# Altium schematic symbol library Regulator_Switching.SchLib: 1070 symbols (part 1 of 9) (continued)
## BD9G341EFJ (continued)

## BD9001F
designator *  value BD9001F
ki_keywords: DC-DC Step-Down Switching Regulator; ki_description: 48V 2A, Flexible Step-Down Switching Regulator, SO-8; ki_fp_filters: SOIC*3.9x4.9mm*P1.27mm*; Footprint: Package_SO:SOIC-8_3.9x4.9mm_P1.27mm; Supplier: http://rohmfs.rohm.com/en/products/databook/datasheet/ic/power/switching_regulator/bd9778f-e.pdf
footprint SOIC-8_3.9x4.9mm_P1.27mm
pins: 1 SW (out), 2 NC (in) hidden, 3 FB, 4 INV (in), 6 RT, 7 GND (power), 8 VIN (power)

## BD9778F
designator *  value BD9778F
ki_keywords: DC-DC Step-Down Switching Regulator; ki_description: 35V 2A, Flexible Step-Down Switching Regulator, SO-8; ki_fp_filters: SOIC*3.9x4.9mm*P1.27mm*; Footprint: Package_SO:SOIC-8_3.9x4.9mm_P1.27mm; Supplier: http://rohmfs.rohm.com/en/products/databook/datasheet/ic/power/switching_regulator/bd9778f-e.pdf
footprint SOIC-8_3.9x4.9mm_P1.27mm
pins: 1 VIN (power), 2 SW (out), 3 FB, 4 INV (in), 5 EN, 6 RT, 7 GND (power), 8 PVIN (power)

## BD9778HFP
designator *  value BD9778HFP
ki_keywords: DC-DC Step-Down Switching Regulator; ki_description: 35V 2A, Flexible Step-Down Switching Regulator, HRP7; ki_fp_filters: Rohm*HRP7*; Footprint: Package_TO_SOT_SMD:Rohm_HRP7; Supplier: http://rohmfs.rohm.com/en/products/databook/datasheet/ic/power/switching_regulator/bd9778f-e.pdf
footprint Rohm_HRP7
pins: 1 VIN (power), 2 SW (out), 3 FB, 4 GND (power), 5 INV (in), 6 RT, 7 EN

## BD9781HFP
designator *  value BD9781HFP
ki_keywords: DC-DC Step-Down Switching Regulator; ki_description: 35V 4A, Flexible Step-Down Switching Regulator, HRP7; ki_fp_filters: Rohm*HRP7*; Footprint: Package_TO_SOT_SMD:Rohm_HRP7; Supplier: http://rohmfs.rohm.com/en/products/databook/datasheet/ic/power/switching_regulator/bd9778f-e.pdf
footprint Rohm_HRP7
pins: 1 VIN (power), 2 SW (out), 3 RT, 4 GND (power), 5 FB, 6 INV (in), 7 EN/SYNC

## CRE1S0305S3C
designator *  value CRE1S0305S3C
ki_keywords: Murata isolated isolation dc-dc converter transformer; ki_description: 3.3V to 5V 200mA, Isolated 2W Single-Output DC-DC Converter Modules with 3kV isolation, SIP-4; ki_fp_filters: Converter*DCDC*Murata*CRE1xxxxxx3C*; Footprint: Converter_DCDC:Converter_DCDC_Murata_CRE1xxxxxx3C_THT; Supplier: http://power.murata.com/datasheet?/data/power/ncl/kdc_cre1.pdf
footprint Converter_DCDC_Murata_CRE1xxxxxx3C_THT
pins: 1 -VIN (power), 2 +VIN (power), 3 -VOUT (power), 4 +VOUT (power)

## CRE1S0505DC
designator *  value CRE1S0505DC
ki_keywords: Murata isolated isolation dc-dc converter transformer; ki_description: 5V to 5V 200mA DC-DC Converter with 1kV isolation, DC-package; ki_fp_filters: Converter*DCDC*Murata*CRE1xxxxxxDC*; Footprint: Converter_DCDC:Converter_DCDC_Murata_CRE1xxxxxxDC_THT; Supplier: http://power.murata.com/datasheet?/data/power/ncl/kdc_cre1.pdf
footprint Converter_DCDC_Murata_CRE1xxxxxxDC_THT
pins: 1 -VIN (power), 4 +VIN (power), 5 +VOUT (power), 7 -VOUT (power)

## CRE1S0505S3C
designator *  value CRE1S0505S3C
ki_keywords: Murata isolated isolation dc-dc converter transformer; ki_description: 5V to 5V 200mA, Isolated 2W Single-Output DC-DC Converter Modules with 3kV isolation, SIP-4; ki_fp_filters: Converter*DCDC*Murata*CRE1xxxxxx3C*; Footprint: Converter_DCDC:Converter_DCDC_Murata_CRE1xxxxxx3C_THT; Supplier: http://power.murata.com/datasheet?/data/power/ncl/kdc_cre1.pdf
footprint Converter_DCDC_Murata_CRE1xxxxxx3C_THT
pins: 1 -VIN (power), 2 +VIN (power), 3 -VOUT (power), 4 +VOUT (power)

## CRE1S0505SC
designator *  value CRE1S0505SC
ki_keywords: Murata isolated isolation dc-dc converter transformer; ki_description: 5V to 5V 200mA DC-DC Converter with 1kV isolation, SIP-4; ki_fp_filters: Converter*DCDC*Murata*CRE1xxxxxxSC*; Footprint: Converter_DCDC:Converter_DCDC_Murata_CRE1xxxxxxSC_THT; Supplier: http://power.murata.com/datasheet?/data/power/ncl/kdc_cre1.pdf
footprint Converter_DCDC_Murata_CRE1xxxxxxSC_THT
pins: 1 -VIN (power), 2 +VIN (power), 3 -VOUT (power), 4 +VOUT (power)

## CRE1S0515SC
designator *  value CRE1S0515SC
ki_keywords: Murata isolated isolation dc-dc converter transformer; ki_description: 15V to 5V 67mA DC-DC Converter with 1kV isolation, SIP-4; ki_fp_filters: Converter*DCDC*Murata*CRE1xxxxxxSC*; Footprint: Converter_DCDC:Converter_DCDC_Murata_CRE1xxxxxxSC_THT; Supplier: http://power.murata.com/datasheet?/data/power/ncl/kdc_cre1.pdf
footprint Converter_DCDC_Murata_CRE1xxxxxxSC_THT
pins: 1 -VIN (power), 2 +VIN (power), 3 -VOUT (power), 4 +VOUT (power)

## CRE1S1205SC
designator *  value CRE1S1205SC
ki_keywords: Murata isolated isolation dc-dc converter transformer; ki_description: 12V to 5V 200mA DC-DC Converter with 1kV isolation, SIP-4; ki_fp_filters: Converter*DCDC*Murata*CRE1xxxxxxSC*; Footprint: Converter_DCDC:Converter_DCDC_Murata_CRE1xxxxxxSC_THT; Supplier: http://power.murata.com/datasheet?/data/power/ncl/kdc_cre1.pdf
footprint Converter_DCDC_Murata_CRE1xxxxxxSC_THT
pins: 1 -VIN (power), 2 +VIN (power), 3 -VOUT (power), 4 +VOUT (power)

## CRE1S1212SC
designator *  value CRE1S1212SC
ki_keywords: Murata isolated isolation dc-dc converter transformer; ki_description: 12V to 12V 83mA DC-DC Converter with 1kV isolation, SIP-4; ki_fp_filters: Converter*DCDC*Murata*CRE1xxxxxxSC*; Footprint: Converter_DCDC:Converter_DCDC_Murata_CRE1xxxxxxSC_THT; Supplier: http://power.murata.com/datasheet?/data/power/ncl/kdc_cre1.pdf
footprint Converter_DCDC_Murata_CRE1xxxxxxSC_THT
pins: 1 -VIN (power), 2 +VIN (power), 3 -VOUT (power), 4 +VOUT (power)

## CRE1S2405SC
designator *  value CRE1S2405SC
ki_keywords: Murata isolated isolation dc-dc converter transformer; ki_description: 24V to 5V 200mA DC-DC Converter with 1kV isolation, SIP-4; ki_fp_filters: Converter*DCDC*Murata*CRE1xxxxxxSC*; Footprint: Converter_DCDC:Converter_DCDC_Murata_CRE1xxxxxxSC_THT; Supplier: http://power.murata.com/datasheet?/data/power/ncl/kdc_cre1.pdf
footprint Converter_DCDC_Murata_CRE1xxxxxxSC_THT
pins: 1 -VIN (power), 2 +VIN (power), 3 -VOUT (power), 4 +VOUT (power)

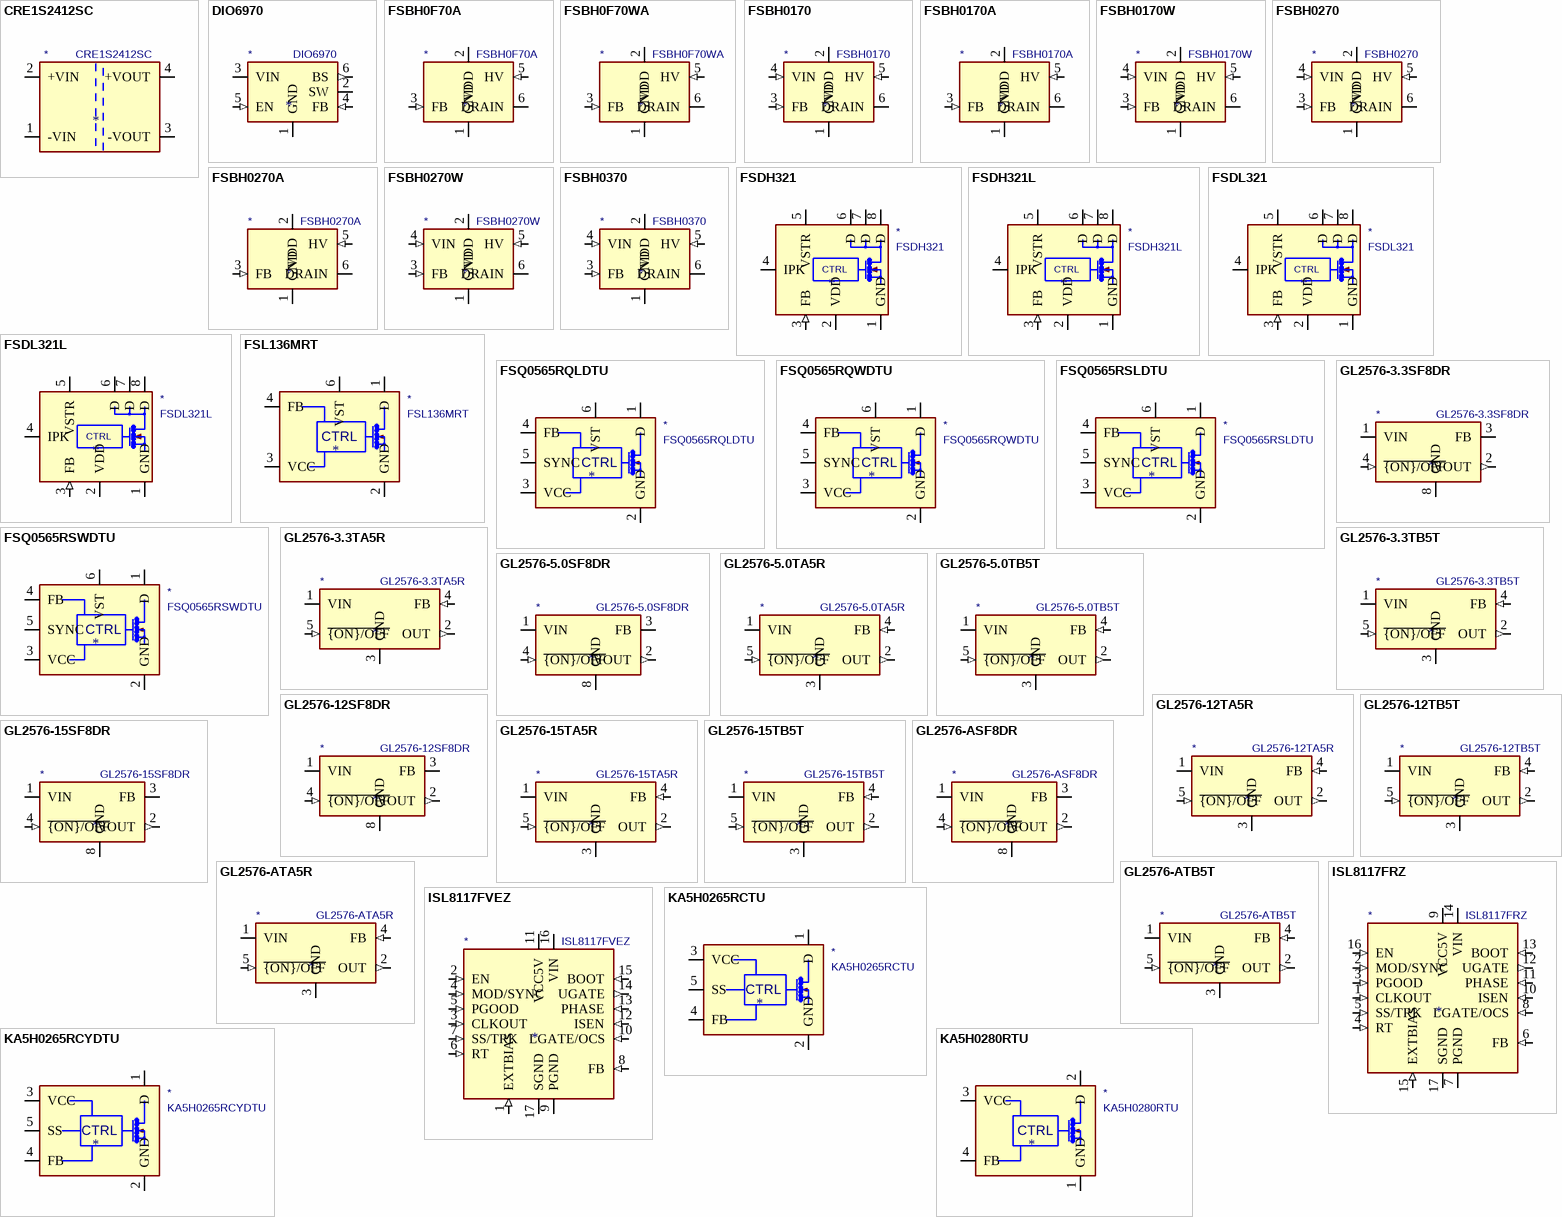
[diagram p2: symbols CRE1S2412SC to KA5H0280RTU]

## CRE1S2412SC
designator *  value CRE1S2412SC
ki_keywords: Murata isolated isolation dc-dc converter transformer; ki_description: 24V to 12V 83mA DC-DC Converter with 1kV isolation, SIP-4; ki_fp_filters: Converter*DCDC*Murata*CRE1xxxxxxSC*; Footprint: Converter_DCDC:Converter_DCDC_Murata_CRE1xxxxxxSC_THT; Supplier: http://power.murata.com/datasheet?/data/power/ncl/kdc_cre1.pdf
footprint Converter_DCDC_Murata_CRE1xxxxxxSC_THT
pins: 1 -VIN (power), 2 +VIN (power), 3 -VOUT (power), 4 +VOUT (power)

## DIO6970
designator *  value DIO6970
ki_keywords: smps buck boost inverting; ki_description: High-Efficiency 2A, 24V Input Synchronous Step Down Converter, SOT-23-6; ki_fp_filters: SOT?23*; Footprint: Package_TO_SOT_SMD:SOT-23-6; Supplier: http://www.dioo.com/uploads/product/20190313/7a4d03690a9be004035eb1035a429f24.pdf
footprint SOT-23-6
pins: 1 GND (power), 2 SW (power), 3 VIN (power), 4 FB (in), 5 EN (in), 6 BS (out)

## FSBH0F70A
designator *  value FSBH0F70A
ki_keywords: smps regulator; ki_description: Green Mode Fairchild Power Switch, 700V Vds, 0.5A Id, 10W/8W 230V/85-265V, DIP-8; ki_fp_filters: DIP*W7.62mm*; Footprint: Package_DIP:DIP-8_W7.62mm; Supplier: https://www.onsemi.com/pub/Collateral/FSBH0270-D.PDF
footprint DIP-8_W7.62mm
pins: 1 GND (power), 2 VDD (power), 3 FB (in), 4 NC (in) hidden, 5 HV (in), 6 DRAIN (oc), 7 DRAIN (oc) hidden, 8 DRAIN (oc) hidden

## FSBH0F70WA
designator *  value FSBH0F70WA
ki_keywords: smps regulator; ki_description: Green Mode Fairchild Power Switch, 700V Vds, 0.5A Id, 10W/8W 230V/85-265V, DIP-8; ki_fp_filters: DIP*W7.62mm*; Footprint: Package_DIP:DIP-8_W7.62mm; Supplier: http://www.onsemi.com/pub/Collateral/FSBH0270W-D.pdf
footprint DIP-8_W7.62mm
pins: 1 GND (power), 2 VDD (power), 3 FB (in), 4 NC (in) hidden, 5 HV (in), 6 DRAIN (oc), 7 DRAIN (oc) hidden, 8 DRAIN (oc) hidden

## FSBH0170
designator *  value FSBH0170
ki_keywords: smps regulator; ki_description: Green Mode Fairchild Power Switch, 700V Vds, 1.0A Id, 15W/13W 230V/85-265V, VIN Pin, DIP-8; ki_fp_filters: DIP*W7.62mm*; Footprint: Package_DIP:DIP-8_W7.62mm; Supplier: https://www.onsemi.com/pub/Collateral/FSBH0270-D.PDF
footprint DIP-8_W7.62mm
pins: 1 GND (power), 2 VDD (power), 3 FB (in), 4 VIN (in), 5 HV (in), 6 DRAIN (oc), 7 DRAIN (oc) hidden, 8 DRAIN (oc) hidden

## FSBH0170A
designator *  value FSBH0170A
ki_keywords: smps regulator; ki_description: Green Mode Fairchild Power Switch, 700V Vds, 1.0A Id, 15W/13W 230V/85-265V, DIP-8; ki_fp_filters: DIP*W7.62mm*; Footprint: Package_DIP:DIP-8_W7.62mm; Supplier: https://www.onsemi.com/pub/Collateral/FSBH0270-D.PDF
footprint DIP-8_W7.62mm
pins: 1 GND (power), 2 VDD (power), 3 FB (in), 4 NC (in) hidden, 5 HV (in), 6 DRAIN (oc), 7 DRAIN (oc) hidden, 8 DRAIN (oc) hidden

## FSBH0170W
designator *  value FSBH0170W
ki_keywords: smps regulator; ki_description: Green Mode Fairchild Power Switch, 700V Vds, 1.0A Id, 15W/13W 230V/85-265V, VIN Pin, DIP-8; ki_fp_filters: DIP*W7.62mm*; Footprint: Package_DIP:DIP-8_W7.62mm; Supplier: http://www.onsemi.com/pub/Collateral/FSBH0270W-D.pdf
footprint DIP-8_W7.62mm
pins: 1 GND (power), 2 VDD (power), 3 FB (in), 4 VIN (in), 5 HV (in), 6 DRAIN (oc), 7 DRAIN (oc) hidden, 8 DRAIN (oc) hidden

## FSBH0270
designator *  value FSBH0270
ki_keywords: smps regulator; ki_description: Green Mode Fairchild Power Switch, 700V Vds, 2.0A Id, 20W/16W 230V/85-265V, VIN Pin, DIP-8; ki_fp_filters: DIP*W7.62mm*; Footprint: Package_DIP:DIP-8_W7.62mm; Supplier: https://www.onsemi.com/pub/Collateral/FSBH0270-D.PDF
footprint DIP-8_W7.62mm
pins: 1 GND (power), 2 VDD (power), 3 FB (in), 4 VIN (in), 5 HV (in), 6 DRAIN (oc), 7 DRAIN (oc) hidden, 8 DRAIN (oc) hidden

## FSBH0270A
designator *  value FSBH0270A
ki_keywords: smps regulator; ki_description: Green Mode Fairchild Power Switch, 700V Vds, 2.0A Id, 20W/16W 230V/85-265V, DIP-8; ki_fp_filters: DIP*W7.62mm*; Footprint: Package_DIP:DIP-8_W7.62mm; Supplier: https://www.onsemi.com/pub/Collateral/FSBH0270-D.PDF
footprint DIP-8_W7.62mm
pins: 1 GND (power), 2 VDD (power), 3 FB (in), 4 NC (in) hidden, 5 HV (in), 6 DRAIN (oc), 7 DRAIN (oc) hidden, 8 DRAIN (oc) hidden

## FSBH0270W
designator *  value FSBH0270W
ki_keywords: smps regulator; ki_description: Green Mode Fairchild Power Switch, 700V Vds, 2.0A Id, 20W/16W 230V/85-265V, VIN Pin, DIP-8; ki_fp_filters: DIP*W7.62mm*; Footprint: Package_DIP:DIP-8_W7.62mm; Supplier: http://www.onsemi.com/pub/Collateral/FSBH0270W-D.pdf
footprint DIP-8_W7.62mm
pins: 1 GND (power), 2 VDD (power), 3 FB (in), 4 VIN (in), 5 HV (in), 6 DRAIN (oc), 7 DRAIN (oc) hidden, 8 DRAIN (oc) hidden

## FSBH0370
designator *  value FSBH0370
ki_keywords: smps regulator; ki_description: Green Mode Fairchild Power Switch, 700V Vds, 3.0A Id, 25W/19W 230V/85-265V, VIN Pin, DIP-8; ki_fp_filters: DIP*W7.62mm*; Footprint: Package_DIP:DIP-8_W7.62mm; Supplier: https://www.onsemi.com/pub/Collateral/FSBH0270-D.PDF
footprint DIP-8_W7.62mm
pins: 1 GND (power), 2 VDD (power), 3 FB (in), 4 VIN (in), 5 HV (in), 6 DRAIN (oc), 7 DRAIN (oc) hidden, 8 DRAIN (oc) hidden

## FSDH321
designator *  value FSDH321
ki_keywords: SMPS Controller with MOSFET 17W AC-DC; ki_description: 17W SMPS Controller, 100kHz, AC-DC, PDIP-8; ki_fp_filters: DIP*W7.62mm*; Footprint: Package_DIP:DIP-8_W7.62mm; Supplier: https://www.onsemi.com/pub/Collateral/FSDH321JP-D.pdf
footprint DIP-8_W7.62mm
pins: 1 GND (power), 2 VDD (power), 3 FB (in), 4 IPK, 5 VSTR, 6 D, 7 D, 8 D
text: CTRL

## FSDH321L
designator *  value FSDH321L
ki_keywords: SMPS Controller with MOSFET 17W AC-DC; ki_description: 17W SMPS Controller, 100kHz, AC-DC, SMD-8; ki_fp_filters: Fairchild*LSOP*; Footprint: Package_DIP:Fairchild_LSOP-8; Supplier: https://www.onsemi.com/pub/Collateral/FSDH321JP-D.pdf
footprint Fairchild_LSOP-8
pins: 1 GND (power), 2 VDD (power), 3 FB (in), 4 IPK, 5 VSTR, 6 D, 7 D, 8 D
text: CTRL

## FSDL321
designator *  value FSDL321
ki_keywords: SMPS Controller with MOSFET 17W AC-DC; ki_description: 17W SMPS Controller, 50kHz, AC-DC, PDIP-8; ki_fp_filters: DIP*W7.62mm*; Footprint: Package_DIP:DIP-8_W7.62mm; Supplier: https://www.onsemi.com/pub/Collateral/FSDH321JP-D.pdf
footprint DIP-8_W7.62mm
pins: 1 GND (power), 2 VDD (power), 3 FB (in), 4 IPK, 5 VSTR, 6 D, 7 D, 8 D
text: CTRL

## FSDL321L
designator *  value FSDL321L
ki_keywords: SMPS Controller with MOSFET 17W AC-DC; ki_description: 17W SMPS Controller, 50kHz, AC-DC, SMD-8; ki_fp_filters: Fairchild*LSOP*; Footprint: Package_DIP:Fairchild_LSOP-8; Supplier: https://www.onsemi.com/pub/Collateral/FSDH321JP-D.pdf
footprint Fairchild_LSOP-8
pins: 1 GND (power), 2 VDD (power), 3 FB (in), 4 IPK, 5 VSTR, 6 D, 7 D, 8 D
text: CTRL

## FSL136MRT
designator *  value FSL136MRT
ki_keywords: SMPS Controller 50W AC-DC; ki_description: 67kHz SMPS Controller w/ Soft Start, max. 50W AC-DC, TO-220F-6L; ki_fp_filters: Fairchild*TO*220F*6L*; Footprint: Package_TO_SOT_THT:Fairchild_TO-220F-6L; Supplier: https://www.onsemi.com/pub/Collateral/FSL136MRT-D.pdf
footprint Fairchild_TO-220F-6L
pins: 1 D, 2 GND (power), 3 VCC (power), 4 FB, 6 VST
text: CTRL

## FSQ0565RQLDTU
designator *  value FSQ0565RQLDTU
ki_keywords: Quasi Resonant SMPS Controller 80W AC-DC; ki_description: 67kHz Quasi Resonant SMPS Controller w/ Soft Start, max. 80W AC-DC, TO-220F-6L (Formed); ki_fp_filters: Fairchild*TO*220F*6L*; Footprint: Package_TO_SOT_THT:Fairchild_TO-220F-6L; Supplier: http://www.onsemi.com/pub/Collateral/FSQ0565RS-D.PDF
footprint Fairchild_TO-220F-6L
pins: 1 D, 2 GND (power), 3 VCC (power), 4 FB, 5 SYNC, 6 VST
text: CTRL

## FSQ0565RQWDTU
designator *  value FSQ0565RQWDTU
ki_keywords: Quasi Resonant SMPS Controller 80W AC-DC; ki_description: 67kHz Quasi Resonant SMPS Controller w/ Soft Start, max. 80W AC-DC, TO-220F-6L; ki_fp_filters: Fairchild*TO*220F*6L*; Footprint: Package_TO_SOT_THT:Fairchild_TO-220F-6L; Supplier: http://www.onsemi.com/pub/Collateral/FSQ0565RS-D.PDF
footprint Fairchild_TO-220F-6L
pins: 1 D, 2 GND (power), 3 VCC (power), 4 FB, 5 SYNC, 6 VST
text: CTRL

## FSQ0565RSLDTU
designator *  value FSQ0565RSLDTU
ki_keywords: Quasi Resonant SMPS Controller 80W AC-DC; ki_description: 67kHz Quasi Resonant SMPS Controller w/ Soft Start, max. 80W AC-DC, TO-220F-6L (Formed); ki_fp_filters: Fairchild*TO*220F*6L*; Footprint: Package_TO_SOT_THT:Fairchild_TO-220F-6L; Supplier: http://www.onsemi.com/pub/Collateral/FSQ0565RS-D.PDF
footprint Fairchild_TO-220F-6L
pins: 1 D, 2 GND (power), 3 VCC (power), 4 FB, 5 SYNC, 6 VST
text: CTRL

## FSQ0565RSWDTU
designator *  value FSQ0565RSWDTU
ki_keywords: Quasi Resonant SMPS Controller 80W AC-DC; ki_description: 67kHz Quasi Resonant SMPS Controller w/ Soft Start, max. 80W AC-DC, TO-220F-6L; ki_fp_filters: Fairchild*TO*220F*6L*; Footprint: Package_TO_SOT_THT:Fairchild_TO-220F-6L; Supplier: http://www.onsemi.com/pub/Collateral/FSQ0565RS-D.PDF
footprint Fairchild_TO-220F-6L
pins: 1 D, 2 GND (power), 3 VCC (power), 4 FB, 5 SYNC, 6 VST
text: CTRL

## GL2576-3.3SF8DR
designator *  value GL2576-3.3SF8DR
ki_keywords: 3.3V 3A 52KHz Buck DC/DC; ki_description: 3.3V 3A, 52KHz Step Down Converter, SO-8; ki_fp_filters: SOIC*3.9x4.9mm*P1.27mm*; Footprint: Package_SO:SOIC-8_3.9x4.9mm_P1.27mm; Supplier: http://www.dianyuan.com/bbs/u/54/437861181916300.pdf
footprint SOIC-8_3.9x4.9mm_P1.27mm
pins: 1 VIN (power), 2 VOUT (out), 3 FB, 4 ~{{ON}/OFF} (in), 5 GND hidden, 6 GND hidden, 7 GND hidden, 8 GND (power)

## GL2576-3.3TA5R
designator *  value GL2576-3.3TA5R
ki_keywords: 3.3V 3A 52KHz Buck DC/DC; ki_description: 3.3V 3A, 52KHz Step Down Converter, TO263-5 (D2-PAK); ki_fp_filters: TO?263*; Footprint: Package_TO_SOT_SMD:TO-263-5_TabPin3; Supplier: http://www.dianyuan.com/bbs/u/54/437861181916300.pdf
footprint TO-263-5_TabPin3
pins: 1 VIN (power), 2 OUT (out), 3 GND (power), 4 FB (in), 5 ~{{ON}/OFF} (in)

## GL2576-3.3TB5T
designator *  value GL2576-3.3TB5T
ki_keywords: 3.3V 3A 52KHz Buck DC/DC; ki_description: 3.3V 3A, 52KHz Step Down Converter, TO220-5; ki_fp_filters: TO?220*; Footprint: Package_TO_SOT_THT:TO-220-5_Vertical; Supplier: http://www.dianyuan.com/bbs/u/54/437861181916300.pdf
footprint TO-220-5_Vertical
pins: 1 VIN (power), 2 OUT (out), 3 GND (power), 4 FB (in), 5 ~{{ON}/OFF} (in)

## GL2576-5.0SF8DR
designator *  value GL2576-5.0SF8DR
ki_keywords: 5V 3A 52KHz Buck DC/DC; ki_description: 5V 3A, 52KHz Step Down Converter, SO-8; ki_fp_filters: SOIC*3.9x4.9mm*P1.27mm*; Footprint: Package_SO:SOIC-8_3.9x4.9mm_P1.27mm; Supplier: http://www.dianyuan.com/bbs/u/54/437861181916300.pdf
footprint SOIC-8_3.9x4.9mm_P1.27mm
pins: 1 VIN (power), 2 VOUT (out), 3 FB, 4 ~{{ON}/OFF} (in), 5 GND hidden, 6 GND hidden, 7 GND hidden, 8 GND (power)

## GL2576-5.0TA5R
designator *  value GL2576-5.0TA5R
ki_keywords: 5V 3A 52KHz Buck DC/DC; ki_description: 5V 3A, 52KHz Step Down Converter, TO263-5 (D2-PAK); ki_fp_filters: TO?263*; Footprint: Package_TO_SOT_SMD:TO-263-5_TabPin3; Supplier: http://www.dianyuan.com/bbs/u/54/437861181916300.pdf
footprint TO-263-5_TabPin3
pins: 1 VIN (power), 2 OUT (out), 3 GND (power), 4 FB (in), 5 ~{{ON}/OFF} (in)

## GL2576-5.0TB5T
designator *  value GL2576-5.0TB5T
ki_keywords: 5V 3A 52KHz Buck DC/DC; ki_description: 5V 3A, 52KHz Step Down Converter, TO220-5; ki_fp_filters: TO?220*; Footprint: Package_TO_SOT_THT:TO-220-5_Vertical; Supplier: http://www.dianyuan.com/bbs/u/54/437861181916300.pdf
footprint TO-220-5_Vertical
pins: 1 VIN (power), 2 OUT (out), 3 GND (power), 4 FB (in), 5 ~{{ON}/OFF} (in)

## GL2576-12SF8DR
designator *  value GL2576-12SF8DR
ki_keywords: 12V 3A 52KHz Buck DC/DC; ki_description: 12V 3A, 52KHz Step Down Converter, SO-8; ki_fp_filters: SOIC*3.9x4.9mm*P1.27mm*; Footprint: Package_SO:SOIC-8_3.9x4.9mm_P1.27mm; Supplier: http://www.dianyuan.com/bbs/u/54/437861181916300.pdf
footprint SOIC-8_3.9x4.9mm_P1.27mm
pins: 1 VIN (power), 2 VOUT (out), 3 FB, 4 ~{{ON}/OFF} (in), 5 GND hidden, 6 GND hidden, 7 GND hidden, 8 GND (power)

## GL2576-12TA5R
designator *  value GL2576-12TA5R
ki_keywords: 12V 3A 52KHz Buck DC/DC; ki_description: 12V 3A, 52KHz Step Down Converter, TO263-5 (D2-PAK); ki_fp_filters: TO?263*; Footprint: Package_TO_SOT_SMD:TO-263-5_TabPin3; Supplier: http://www.dianyuan.com/bbs/u/54/437861181916300.pdf
footprint TO-263-5_TabPin3
pins: 1 VIN (power), 2 OUT (out), 3 GND (power), 4 FB (in), 5 ~{{ON}/OFF} (in)

## GL2576-12TB5T
designator *  value GL2576-12TB5T
ki_keywords: 12V 3A 52KHz Buck DC/DC; ki_description: 12V 3A, 52KHz Step Down Converter, TO220-5; ki_fp_filters: TO?220*; Footprint: Package_TO_SOT_THT:TO-220-5_Vertical; Supplier: http://www.dianyuan.com/bbs/u/54/437861181916300.pdf
footprint TO-220-5_Vertical
pins: 1 VIN (power), 2 OUT (out), 3 GND (power), 4 FB (in), 5 ~{{ON}/OFF} (in)

## GL2576-15SF8DR
designator *  value GL2576-15SF8DR
ki_keywords: 15V 3A 52KHz Buck DC/DC; ki_description: 15V 3A, 52KHz Step Down Converter, SO-8; ki_fp_filters: SOIC*3.9x4.9mm*P1.27mm*; Footprint: Package_SO:SOIC-8_3.9x4.9mm_P1.27mm; Supplier: http://www.dianyuan.com/bbs/u/54/437861181916300.pdf
footprint SOIC-8_3.9x4.9mm_P1.27mm
pins: 1 VIN (power), 2 VOUT (out), 3 FB, 4 ~{{ON}/OFF} (in), 5 GND hidden, 6 GND hidden, 7 GND hidden, 8 GND (power)

## GL2576-15TA5R
designator *  value GL2576-15TA5R
ki_keywords: 15V 3A 52KHz Buck DC/DC; ki_description: 15V 3A, 52KHz Step Down Converter, TO263-5 (D2-PAK); ki_fp_filters: TO?263*; Footprint: Package_TO_SOT_SMD:TO-263-5_TabPin3; Supplier: http://www.dianyuan.com/bbs/u/54/437861181916300.pdf
footprint TO-263-5_TabPin3
pins: 1 VIN (power), 2 OUT (out), 3 GND (power), 4 FB (in), 5 ~{{ON}/OFF} (in)

## GL2576-15TB5T
designator *  value GL2576-15TB5T
ki_keywords: 15V 3A 52KHz Buck DC/DC; ki_description: 15V 3A, 52KHz Step Down Converter, TO220-5; ki_fp_filters: TO?220*; Footprint: Package_TO_SOT_THT:TO-220-5_Vertical; Supplier: http://www.dianyuan.com/bbs/u/54/437861181916300.pdf
footprint TO-220-5_Vertical
pins: 1 VIN (power), 2 OUT (out), 3 GND (power), 4 FB (in), 5 ~{{ON}/OFF} (in)

## GL2576-ASF8DR
designator *  value GL2576-ASF8DR
ki_keywords: Adjustable 3A 52KHz Buck DC/DC; ki_description: Adjustable 3A, 52KHz Step Down Converter, SO-8; ki_fp_filters: SOIC*3.9x4.9mm*P1.27mm*; Footprint: Package_SO:SOIC-8_3.9x4.9mm_P1.27mm; Supplier: http://www.dianyuan.com/bbs/u/54/437861181916300.pdf
footprint SOIC-8_3.9x4.9mm_P1.27mm
pins: 1 VIN (power), 2 VOUT (out), 3 FB, 4 ~{{ON}/OFF} (in), 5 GND hidden, 6 GND hidden, 7 GND hidden, 8 GND (power)

## GL2576-ATA5R
designator *  value GL2576-ATA5R
ki_keywords: Adjustable 3A 52KHz Buck DC/DC; ki_description: Adjustable 3A, 52KHz Step Down Converter, TO263-5 (D2-PAK); ki_fp_filters: TO?263*; Footprint: Package_TO_SOT_SMD:TO-263-5_TabPin3; Supplier: http://www.dianyuan.com/bbs/u/54/437861181916300.pdf
footprint TO-263-5_TabPin3
pins: 1 VIN (power), 2 OUT (out), 3 GND (power), 4 FB (in), 5 ~{{ON}/OFF} (in)

## GL2576-ATB5T
designator *  value GL2576-ATB5T
ki_keywords: Adjustable 3A 52KHz Buck DC/DC; ki_description: Adjustable 3A, 52KHz Step Down Converter, TO220-5; ki_fp_filters: TO?220*; Footprint: Package_TO_SOT_THT:TO-220-5_Vertical; Supplier: http://www.dianyuan.com/bbs/u/54/437861181916300.pdf
footprint TO-220-5_Vertical
pins: 1 VIN (power), 2 OUT (out), 3 GND (power), 4 FB (in), 5 ~{{ON}/OFF} (in)

## ISL8117FRZ
designator *  value ISL8117FRZ
ki_keywords: PWM step down buck converter controller synchronous POL; ki_description: Synchronous step-down PWM controller, 4.5v to 60v input, 0.6v to 54v Output Voltage, QFN-16; ki_fp_filters: QFN*1EP*4x4mm*P0.5mm*; Footprint: Package_DFN_QFN:QFN-16-1EP_4x4mm_P0.5mm_EP2.45x2.45mm; Supplier: https://www.intersil.com/content/dam/Intersil/documents/isl8/isl8117.pdf
footprint QFN-16-1EP_4x4mm_P0.5mm_EP2.45x2.45mm
pins: 1 CLKOUT (in), 2 MOD/SYNC (in), 3 PGOOD (in), 4 RT (in), 5 SS/TRK (in), 6 FB (in), 7 PGND (power), 8 LGATE/OCS (in), 9 VCC5V (power), 10 ISEN (in), 11 PHASE (in), 12 UGATE (out), 13 BOOT (in), 14 VIN (power), 15 EXTBIAS (in), 16 EN (in), 17 SGND (power)

## ISL8117FVEZ
designator *  value ISL8117FVEZ
ki_keywords: PWM step down buck converter controller synchronous POL; ki_description: Synchronous step-down PWM controller, 4.5v to 60v input, 0.6v to 54v Output Voltage, HTSSOP-16; ki_fp_filters: HTSSOP*EP*4.4x5mm*P0.65mm*; Footprint: Package_SO:HTSSOP-16-1EP_4.4x5mm_P0.65mm_EP3.4x5mm; Supplier: https://www.intersil.com/content/dam/Intersil/documents/isl8/isl8117.pdf
footprint HTSSOP-16-1EP_4.4x5mm_P0.65mm_EP3.4x5mm
pins: 1 EXTBIAS (in), 2 EN (in), 3 CLKOUT (in), 4 MOD/SYNC (in), 5 PGOOD (in), 6 RT (in), 7 SS/TRK (in), 8 FB (in), 9 PGND (power), 10 LGATE/OCS (in), 11 VCC5V (power), 12 ISEN (in), 13 PHASE (in), 14 UGATE (out), 15 BOOT (in), 16 VIN (power), 17 SGND (power)

## KA5H0265RCTU
designator *  value KA5H0265RCTU
ki_keywords: SMPS Controller AC-DC; ki_description: 100kHz SMPS Controller w/ Soft Start, AC-DC, TO-220F-5L; ki_fp_filters: *TO*220*5L*; Footprint: Package_TO_SOT_THT:ONSemi_TO-220-5L; Supplier: http://www.onsemi.com/pub/Collateral/KA5L0265R-D.PDF
footprint ONSemi_TO-220-5L
pins: 1 D, 2 GND (power), 3 VCC (power), 4 FB, 5 SS
text: CTRL

## KA5H0265RCYDTU
designator *  value KA5H0265RCYDTU
ki_keywords: SMPS Controller AC-DC; ki_description: KA5H0265RCTU, 100kHz SMPS Controller w/ Soft Start, AC-DC, TO-220F-5L(Forming); ki_fp_filters: *TO*220*5L*; Footprint: Package_TO_SOT_THT:ONSemi_TO-220-5L_Forming; Supplier: http://www.onsemi.com/pub/Collateral/KA5L0265R-D.PDF
footprint ONSemi_TO-220-5L_Forming
pins: 1 D, 2 GND (power), 3 VCC (power), 4 FB, 5 SS
text: CTRL

## KA5H0280RTU
designator *  value KA5H0280RTU
ki_keywords: SMPS Controller AC-DC; ki_description: 100kHz SMPS Controller, AC-DC, TO-220F-4L; ki_fp_filters: *TO*220*4*; Footprint: Package_TO_SOT_THT:TO-220-4_Vertical; Supplier: http://www.onsemi.com/pub/Collateral/KA5L0265R-D.PDF
footprint TO-220-4_Vertical
pins: 1 GND (power), 2 D, 3 VCC (power), 4 FB
text: CTRL

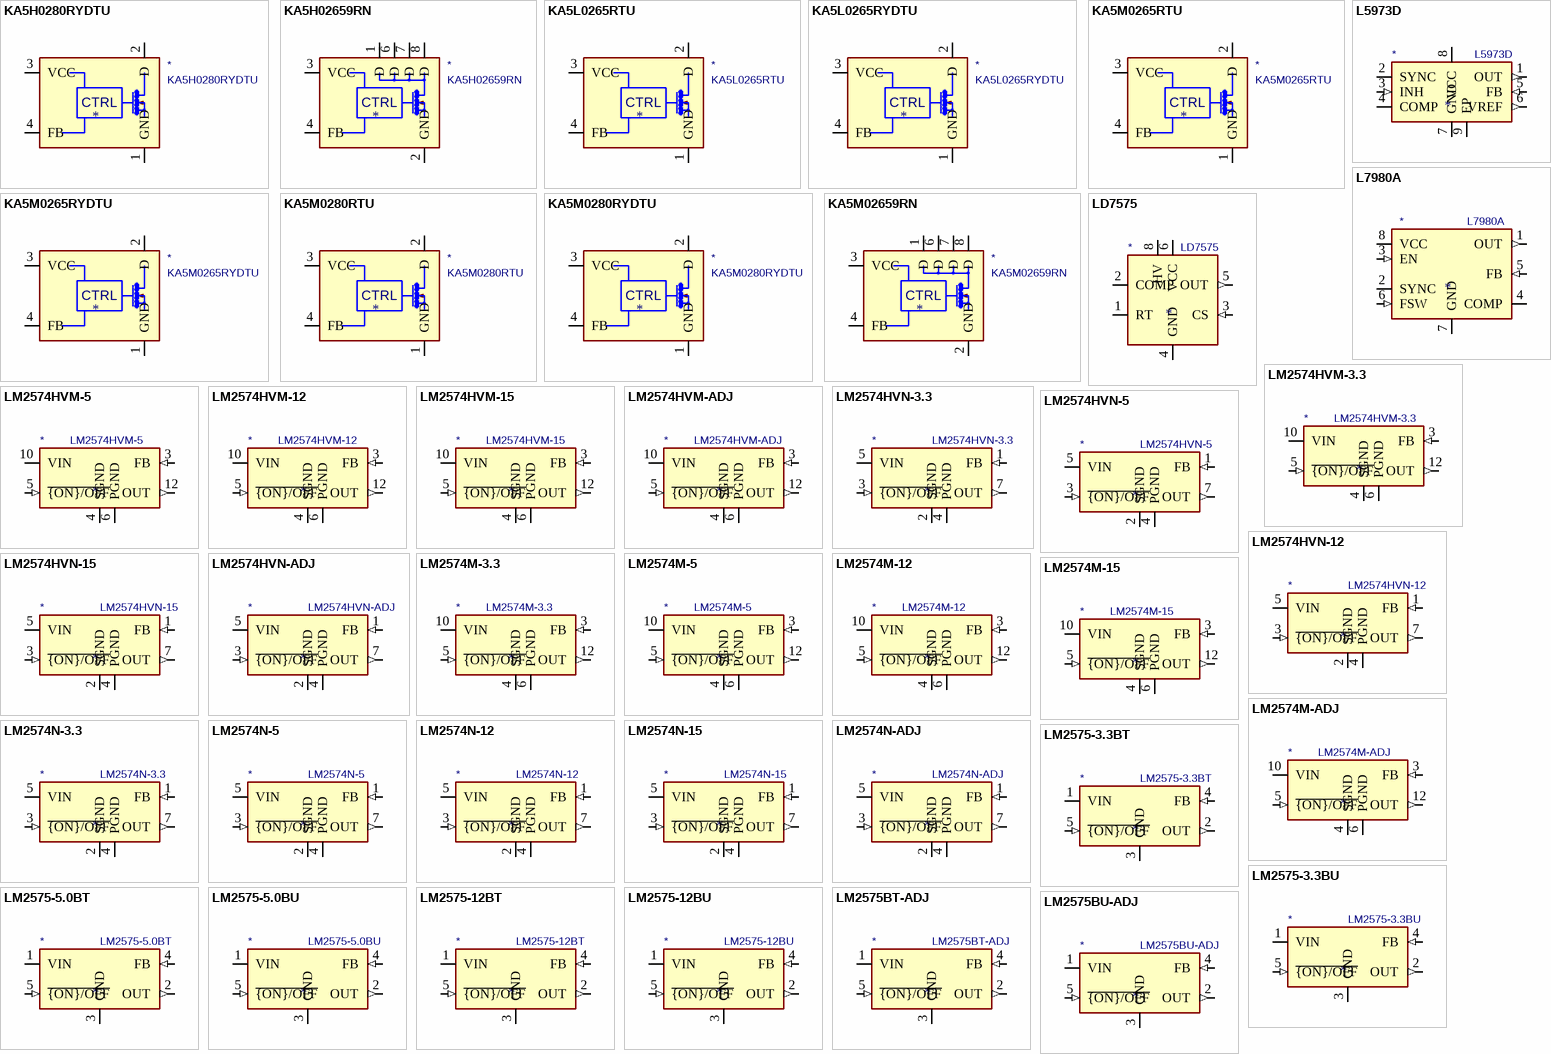
[diagram p3: symbols KA5H0280RYDTU to LM2575BU-ADJ]

## KA5H0280RYDTU
designator *  value KA5H0280RYDTU
ki_keywords: SMPS Controller AC-DC; ki_description: 100kHz SMPS Controller, AC-DC, TO-220F-4L(Forming); ki_fp_filters: *TO*220*4*; Footprint: Package_TO_SOT_THT:ONSemi_TO-220F-4L_Forming; Supplier: http://www.onsemi.com/pub/Collateral/KA5L0265R-D.PDF
footprint ONSemi_TO-220F-4L_Forming
pins: 1 GND (power), 2 D, 3 VCC (power), 4 FB
text: CTRL

## KA5H02659RN
designator *  value KA5H02659RN
ki_keywords: SMPS Controller AC-DC; ki_description: 100kHz SMPS Controller, AC-DC, PDIP-8; ki_fp_filters: DIP*8*W7.62mm*; Footprint: Package_DIP:DIP-8_W7.62mm; Supplier: http://www.onsemi.com/pub/Collateral/KA5L0265R-D.PDF
footprint DIP-8_W7.62mm
pins: 1 D, 2 GND (power), 3 VCC (power), 4 FB, 6 D, 7 D, 8 D
text: CTRL

## KA5L0265RTU
designator *  value KA5L0265RTU
ki_keywords: SMPS Controller AC-DC; ki_description: 50kHz SMPS Controller, AC-DC, TO-220F-4L; ki_fp_filters: *TO*220*4*; Footprint: Package_TO_SOT_THT:TO-220-4_Vertical; Supplier: http://www.onsemi.com/pub/Collateral/KA5L0265R-D.PDF
footprint TO-220-4_Vertical
pins: 1 GND (power), 2 D, 3 VCC (power), 4 FB
text: CTRL

## KA5L0265RYDTU
designator *  value KA5L0265RYDTU
ki_keywords: SMPS Controller AC-DC; ki_description: 50kHz SMPS Controller, AC-DC, TO-220F-4L(Forming); ki_fp_filters: *TO*220*4*; Footprint: Package_TO_SOT_THT:ONSemi_TO-220F-4L_Forming; Supplier: http://www.onsemi.com/pub/Collateral/KA5L0265R-D.PDF
footprint ONSemi_TO-220F-4L_Forming
pins: 1 GND (power), 2 D, 3 VCC (power), 4 FB
text: CTRL

## KA5M0265RTU
designator *  value KA5M0265RTU
ki_keywords: SMPS Controller AC-DC; ki_description: 67kHz SMPS Controller, AC-DC, TO-220F-4L; ki_fp_filters: *TO*220*4*; Footprint: Package_TO_SOT_THT:TO-220-4_Vertical; Supplier: http://www.onsemi.com/pub/Collateral/KA5L0265R-D.PDF
footprint TO-220-4_Vertical
pins: 1 GND (power), 2 D, 3 VCC (power), 4 FB
text: CTRL

## KA5M0265RYDTU
designator *  value KA5M0265RYDTU
ki_keywords: SMPS Controller AC-DC; ki_description: 67kHz SMPS Controller, AC-DC, TO-220F-4L(Forming); ki_fp_filters: *TO*220*4*; Footprint: Package_TO_SOT_THT:ONSemi_TO-220F-4L_Forming; Supplier: http://www.onsemi.com/pub/Collateral/KA5L0265R-D.PDF
footprint ONSemi_TO-220F-4L_Forming
pins: 1 GND (power), 2 D, 3 VCC (power), 4 FB
text: CTRL

## KA5M0280RTU
designator *  value KA5M0280RTU
ki_keywords: SMPS Controller AC-DC; ki_description: 67kHz SMPS Controller, AC-DC, TO-220F-4L; ki_fp_filters: *TO*220*4*; Footprint: Package_TO_SOT_THT:TO-220-4_Vertical; Supplier: http://www.onsemi.com/pub/Collateral/KA5L0265R-D.PDF
footprint TO-220-4_Vertical
pins: 1 GND (power), 2 D, 3 VCC (power), 4 FB
text: CTRL

## KA5M0280RYDTU
designator *  value KA5M0280RYDTU
ki_keywords: SMPS Controller AC-DC; ki_description: KA5M0280RTDTU, 67kHz SMPS Controller, AC-DC, TO-220F-4L(Forming); ki_fp_filters: *TO*220*4*; Footprint: Package_TO_SOT_THT:ONSemi_TO-220F-4L_Forming; Supplier: http://www.onsemi.com/pub/Collateral/KA5L0265R-D.PDF
footprint ONSemi_TO-220F-4L_Forming
pins: 1 GND (power), 2 D, 3 VCC (power), 4 FB
text: CTRL

## KA5M02659RN
designator *  value KA5M02659RN
ki_keywords: SMPS Controller AC-DC; ki_description: 67kHz SMPS Controller, AC-DC, PDIP-8; ki_fp_filters: DIP*8*W7.62mm*; Footprint: Package_DIP:DIP-8_W7.62mm; Supplier: http://www.onsemi.com/pub/Collateral/KA5L0265R-D.PDF
footprint DIP-8_W7.62mm
pins: 1 D, 2 GND (power), 3 VCC (power), 4 FB, 6 D, 7 D, 8 D
text: CTRL

## L5973D
designator *  value L5973D
ki_keywords: step down buck regulator; ki_description: 2.5A step down switching regulator, HSOP-8; ki_fp_filters: HSOP*EP*3.9x4.9mm*P1.27mm*; Footprint: Package_SO:HSOP-8-1EP_3.9x4.9mm_P1.27mm_EP2.41x3.1mm_ThermalVias; Supplier: http://www.st.com/resource/en/datasheet/l5973d.pdf
footprint HSOP-8-1EP_3.9x4.9mm_P1.27mm_EP2.41x3.1mm_ThermalVias
pins: 1 OUT (out), 2 SYNC (io), 3 INH (in), 4 COMP, 5 FB (in), 6 VREF (out), 7 GND (power), 8 VCC (power), 9 EP

## L7980A
designator *  value L7980A
ki_keywords: step down buck regulator; ki_description: 2A step down switching regulator, HSOP-8; ki_fp_filters: HSOP*EP*3.9x4.9mm*P1.27mm*; Footprint: Package_SO:HSOP-8-1EP_3.9x4.9mm_P1.27mm_EP2.3x2.3mm; Supplier: https://www.st.com/resource/en/datasheet/l7980.pdf
footprint HSOP-8-1EP_3.9x4.9mm_P1.27mm_EP2.3x2.3mm
pins: 1 OUT (out), 2 SYNC (io), 3 EN (in), 4 COMP, 5 FB (in), 6 FSW (in), 7 GND (power), 8 VCC (power), 9 GND hidden

## LD7575
designator *  value LD7575
ki_keywords: smps controller; ki_description: Green-Mode PWM Controller with High-Voltage Start-Up Circuit, DIP-8/SOIC-8; ki_fp_filters: SOIC*3.9x4.9mm*P1.27mm* DIP*W7.62mm*; Supplier: http://www.leadtrend.com.tw/archive/doc/product/sheets/LD7575-DS-04b.pdf
pins: 1 RT, 2 COMP, 3 CS (in), 4 GND (power), 5 OUT (out), 6 VCC (power), 7 NC (in) hidden, 8 HV

## LM2574HVM-3.3
designator *  value LM2574HVM-3.3
ki_keywords: Step-Down Voltage Regulator 3.3V 500mA HV; ki_description: 3.3V, 0.5A SIMPLE SWITCHER® Step-Down Voltage Regulator, High Voltage Input, SO-8; ki_fp_filters: SOIC*7.5x9mm*P1.27mm*; Footprint: Package_SO:SOIC-14W_7.5x9mm_P1.27mm; Supplier: http://www.national.com/ds/LM/LM2574.pdf
footprint SOIC-14W_7.5x9mm_P1.27mm
pins: 3 FB (in), 4 SGND (power), 5 ~{{ON}/OFF} (in), 6 PGND (power), 10 VIN (power), 12 OUT (out)

## LM2574HVM-5
designator *  value LM2574HVM-5
ki_keywords: Step-Down Voltage Regulator 5V 500mA HV; ki_description: 5V, 0.5A SIMPLE SWITCHER® Step-Down Voltage Regulator, High Voltage Input, SO-8; ki_fp_filters: SOIC*7.5x9mm*P1.27mm*; Footprint: Package_SO:SOIC-14W_7.5x9mm_P1.27mm; Supplier: http://www.national.com/ds/LM/LM2574.pdf
footprint SOIC-14W_7.5x9mm_P1.27mm
pins: 3 FB (in), 4 SGND (power), 5 ~{{ON}/OFF} (in), 6 PGND (power), 10 VIN (power), 12 OUT (out)

## LM2574HVM-12
designator *  value LM2574HVM-12
ki_keywords: Step-Down Voltage Regulator 12V 500mA HV; ki_description: 12V, 0.5A Step-Down Voltage Regulator, High Voltage Input, SO-8; ki_fp_filters: SOIC*7.5x9mm*P1.27mm*; Footprint: Package_SO:SOIC-14W_7.5x9mm_P1.27mm; Supplier: http://www.ti.com/lit/ds/symlink/lm2574.pdf
footprint SOIC-14W_7.5x9mm_P1.27mm
pins: 3 FB (in), 4 SGND (power), 5 ~{{ON}/OFF} (in), 6 PGND (power), 10 VIN (power), 12 OUT (out)

## LM2574HVM-15
designator *  value LM2574HVM-15
ki_keywords: Step-Down Voltage Regulator 15V 500mA HV; ki_description: 15V, 0.5A SIMPLE SWITCHER® Step-Down Voltage Regulator, High Voltage Input, SO-8; ki_fp_filters: SOIC*7.5x9mm*P1.27mm*; Footprint: Package_SO:SOIC-14W_7.5x9mm_P1.27mm; Supplier: http://www.national.com/ds/LM/LM2574.pdf
footprint SOIC-14W_7.5x9mm_P1.27mm
pins: 3 FB (in), 4 SGND (power), 5 ~{{ON}/OFF} (in), 6 PGND (power), 10 VIN (power), 12 OUT (out)

## LM2574HVM-ADJ
designator *  value LM2574HVM-ADJ
ki_keywords: Step-Down Voltage Regulator Adjustable 500mA HV; ki_description: Adjustable Output Voltage, 0.5A SIMPLE SWITCHER® Step-Down Voltage Regulator, High Voltage Input, SO-8; ki_fp_filters: SOIC*7.5x9mm*P1.27mm*; Footprint: Package_SO:SOIC-14W_7.5x9mm_P1.27mm; Supplier: http://www.national.com/ds/LM/LM2574.pdf
footprint SOIC-14W_7.5x9mm_P1.27mm
pins: 3 FB (in), 4 SGND (power), 5 ~{{ON}/OFF} (in), 6 PGND (power), 10 VIN (power), 12 OUT (out)

## LM2574HVN-3.3
designator *  value LM2574HVN-3.3
ki_keywords: Step-Down Voltage Regulator 3.3V 500mA HV; ki_description: 3.3V, 0.5A SIMPLE SWITCHER® Step-Down Voltage Regulator, High Voltage Input, DIP-8; ki_fp_filters: DIP*W7.62mm*; Footprint: Package_DIP:DIP-8_W7.62mm; Supplier: http://www.national.com/ds/LM/LM2574.pdf
footprint DIP-8_W7.62mm
pins: 1 FB (in), 2 SGND (power), 3 ~{{ON}/OFF} (in), 4 PGND (power), 5 VIN (power), 6 NC (in) hidden, 7 OUT (out), 8 NC (in) hidden

## LM2574HVN-5
designator *  value LM2574HVN-5
ki_keywords: Step-Down Voltage Regulator 5V 500mA HV; ki_description: 5V, 0.5A SIMPLE SWITCHER® Step-Down Voltage Regulator, High Voltage Input, DIP-8; ki_fp_filters: DIP*W7.62mm*; Footprint: Package_DIP:DIP-8_W7.62mm; Supplier: http://www.national.com/ds/LM/LM2574.pdf
footprint DIP-8_W7.62mm
pins: 1 FB (in), 2 SGND (power), 3 ~{{ON}/OFF} (in), 4 PGND (power), 5 VIN (power), 6 NC (in) hidden, 7 OUT (out), 8 NC (in) hidden

## LM2574HVN-12
designator *  value LM2574HVN-12
ki_keywords: Step-Down Voltage Regulator 12V 500mA HV; ki_description: 12V, 0.5A Step-Down Voltage Regulator, High Voltage Input, DIP-8; ki_fp_filters: DIP*W7.62mm*; Footprint: Package_DIP:DIP-8_W7.62mm; Supplier: http://www.ti.com/lit/ds/symlink/lm2574.pdf
footprint DIP-8_W7.62mm
pins: 1 FB (in), 2 SGND (power), 3 ~{{ON}/OFF} (in), 4 PGND (power), 5 VIN (power), 6 NC (in) hidden, 7 OUT (out), 8 NC (in) hidden

## LM2574HVN-15
designator *  value LM2574HVN-15
ki_keywords: Step-Down Voltage Regulator 15V 500mA HV; ki_description: 15V, 0.5A SIMPLE SWITCHER® Step-Down Voltage Regulator, High Voltage Input, DIP-8; ki_fp_filters: DIP*W7.62mm*; Footprint: Package_DIP:DIP-8_W7.62mm; Supplier: http://www.national.com/ds/LM/LM2574.pdf
footprint DIP-8_W7.62mm
pins: 1 FB (in), 2 SGND (power), 3 ~{{ON}/OFF} (in), 4 PGND (power), 5 VIN (power), 6 NC (in) hidden, 7 OUT (out), 8 NC (in) hidden

## LM2574HVN-ADJ
designator *  value LM2574HVN-ADJ
ki_keywords: Step-Down Voltage Regulator Adjustable 500mA HV; ki_description: Adjustable Output Voltage, 0.5A SIMPLE SWITCHER® Step-Down Voltage Regulator, High Voltage Input, DIP-8; ki_fp_filters: DIP*W7.62mm*; Footprint: Package_DIP:DIP-8_W7.62mm; Supplier: http://www.national.com/ds/LM/LM2574.pdf
footprint DIP-8_W7.62mm
pins: 1 FB (in), 2 SGND (power), 3 ~{{ON}/OFF} (in), 4 PGND (power), 5 VIN (power), 6 NC (in) hidden, 7 OUT (out), 8 NC (in) hidden

## LM2574M-3.3
designator *  value LM2574M-3.3
ki_keywords: Step-Down Voltage Regulator 3.3V 500mA; ki_description: 3.3V, 0.5A SIMPLE SWITCHER® Step-Down Voltage Regulator, SO-8; ki_fp_filters: SOIC*7.5x9mm*P1.27mm*; Footprint: Package_SO:SOIC-14W_7.5x9mm_P1.27mm; Supplier: http://www.national.com/ds/LM/LM2574.pdf
footprint SOIC-14W_7.5x9mm_P1.27mm
pins: 3 FB (in), 4 SGND (power), 5 ~{{ON}/OFF} (in), 6 PGND (power), 10 VIN (power), 12 OUT (out)

## LM2574M-5
designator *  value LM2574M-5
ki_keywords: Step-Down Voltage Regulator 5V 500mA; ki_description: 5V, 0.5A SIMPLE SWITCHER® Step-Down Voltage Regulator, SO-8; ki_fp_filters: SOIC*7.5x9mm*P1.27mm*; Footprint: Package_SO:SOIC-14W_7.5x9mm_P1.27mm; Supplier: http://www.national.com/ds/LM/LM2574.pdf
footprint SOIC-14W_7.5x9mm_P1.27mm
pins: 3 FB (in), 4 SGND (power), 5 ~{{ON}/OFF} (in), 6 PGND (power), 10 VIN (power), 12 OUT (out)